# Altium footprint library 封装库.PcbLib: 755 footprints (part 5 of 48) (continued)
## BGA27X27-B352 [mm] (continued)
Top Overlay:
  lines w0.2: -1,-26 26,-26 26,1 -0.5,1 -1,0.5 -1,-26

## BGA27X27-B429 [mm]
pads (429):
  round 0.6 smd: A3(2.54,0) A4(3.81,0) A5(5.08,0) A6(6.35,0) A7(7.62,0) A8(8.89,0) A9(10.16,0) A10(11.43,0) A11(12.7,0) A12(13.97,0) A13(15.24,0) A14(16.51,0) A15(17.78,0) A16(19.05,0) A17(20.32,0) A18(21.59,0) A19(22.86,0) AA3(2.54,-25.4) AA4(3.81,-25.4) AA5(5.08,-25.4) AA6(6.35,-25.4) AA7(7.62,-25.4) AA8(8.89,-25.4) AA9(10.16,-25.4) AA10(11.43,-25.4) AA11(12.7,-25.4) AA12(13.97,-25.4) AA13(15.24,-25.4) AA14(16.51,-25.4) AA15(17.78,-25.4) AA16(19.05,-25.4) AA17(20.32,-25.4) AA18(21.59,-25.4) AA19(22.86,-25.4) B2(1.27,-1.27) B3(2.54,-1.27) B4(3.81,-1.27) B5(5.08,-1.27) B6(6.35,-1.27) B7(7.62,-1.27) B8(8.89,-1.27) B9(10.16,-1.27) B10(11.43,-1.27) B11(12.7,-1.27) B12(13.97,-1.27) B13(15.24,-1.27) B14(16.51,-1.27) B15(17.78,-1.27) B16(19.05,-1.27) B17(20.32,-1.27) B18(21.59,-1.27) B19(22.86,-1.27) B20(24.13,-1.27) C1(0,-2.54) C2(1.27,-2.54) C3(2.54,-2.54) C4(3.81,-2.54) C5(5.08,-2.54) C6(6.35,-2.54) C7(7.62,-2.54) C8(8.89,-2.54) C9(10.16,-2.54) C10(11.43,-2.54) C11(12.7,-2.54) C12(13.97,-2.54) C13(15.24,-2.54) C14(16.51,-2.54) C15(17.78,-2.54) C16(19.05,-2.54) C17(20.32,-2.54) C18(21.59,-2.54) C19(22.86,-2.54) C20(24.13,-2.54) C21(25.4,-2.54) D1(0,-3.81) D2(1.27,-3.81) D3(2.54,-3.81) D4(3.81,-3.81) D5(5.08,-3.81) D6(6.35,-3.81) D7(7.62,-3.81) D8(8.89,-3.81) D9(10.16,-3.81) D10(11.43,-3.81) D11(12.7,-3.81) D12(13.97,-3.81) D13(15.24,-3.81) D14(16.51,-3.81) D15(17.78,-3.81) D16(19.05,-3.81) D17(20.32,-3.81) D18(21.59,-3.81) D19(22.86,-3.81) D20(24.13,-3.81) D21(25.4,-3.81) E1(0,-5.08) E2(1.27,-5.08) E3(2.54,-5.08) E4(3.81,-5.08) E5(5.08,-5.08) E6(6.35,-5.08) E7(7.62,-5.08) E8(8.89,-5.08) E9(10.16,-5.08) E10(11.43,-5.08) E11(12.7,-5.08) E12(13.97,-5.08) E13(15.24,-5.08) E14(16.51,-5.08) E15(17.78,-5.08) E16(19.05,-5.08) E17(20.32,-5.08) E18(21.59,-5.08) E19(22.86,-5.08) E20(24.13,-5.08) E21(25.4,-5.08) F1(0,-6.35) F2(1.27,-6.35) F3(2.54,-6.35) F4(3.81,-6.35) F5(5.08,-6.35) F6(6.35,-6.35) F7(7.62,-6.35) F8(8.89,-6.35) F9(10.16,-6.35) F10(11.43,-6.35) F11(12.7,-6.35) F12(13.97,-6.35) F13(15.24,-6.35) F14(16.51,-6.35) F15(17.78,-6.35) F16(19.05,-6.35) F17(20.32,-6.35) F18(21.59,-6.35) F19(22.86,-6.35) F20(24.13,-6.35) F21(25.4,-6.35) G1(0,-7.62) G2(1.27,-7.62) G3(2.54,-7.62) G4(3.81,-7.62) G5(5.08,-7.62) G6(6.35,-7.62) G7(7.62,-7.62) G8(8.89,-7.62) G9(10.16,-7.62) G10(11.43,-7.62) G11(12.7,-7.62) G12(13.97,-7.62) G13(15.24,-7.62) G14(16.51,-7.62) G15(17.78,-7.62) G16(19.05,-7.62) G17(20.32,-7.62) G18(21.59,-7.62) G19(22.86,-7.62) G20(24.13,-7.62) G21(25.4,-7.62) H1(0,-8.89) H2(1.27,-8.89) H3(2.54,-8.89) H4(3.81,-8.89) H5(5.08,-8.89) H6(6.35,-8.89) H7(7.62,-8.89) H8(8.89,-8.89) H9(10.16,-8.89) H10(11.43,-8.89) H11(12.7,-8.89) H12(13.97,-8.89) H13(15.24,-8.89) H14(16.51,-8.89) H15(17.78,-8.89) H16(19.05,-8.89) H17(20.32,-8.89) H18(21.59,-8.89) H19(22.86,-8.89) H20(24.13,-8.89) H21(25.4,-8.89) J1(0,-10.16) J2(1.27,-10.16) J3(2.54,-10.16) J4(3.81,-10.16) J5(5.08,-10.16) J6(6.35,-10.16) J7(7.62,-10.16) J8(8.89,-10.16) J9(10.16,-10.16) J10(11.43,-10.16) J11(12.7,-10.16) J12(13.97,-10.16) J13(15.24,-10.16) J14(16.51,-10.16) J15(17.78,-10.16) J16(19.05,-10.16) J17(20.32,-10.16) J18(21.59,-10.16) J19(22.86,-10.16) J20(24.13,-10.16) J21(25.4,-10.16) K1(0,-11.43) K2(1.27,-11.43) K3(2.54,-11.43) K4(3.81,-11.43) K5(5.08,-11.43) K6(6.35,-11.43) K7(7.62,-11.43) K8(8.89,-11.43) K9(10.16,-11.43) K10(11.43,-11.43) K11(12.7,-11.43) K12(13.97,-11.43) K13(15.24,-11.43) K14(16.51,-11.43) K15(17.78,-11.43) K16(19.05,-11.43) K17(20.32,-11.43) K18(21.59,-11.43) K19(22.86,-11.43) K20(24.13,-11.43) K21(25.4,-11.43) L1(0,-12.7) L2(1.27,-12.7) L3(2.54,-12.7) L4(3.81,-12.7) L5(5.08,-12.7) L6(6.35,-12.7) L7(7.62,-12.7) L8(8.89,-12.7) L9(10.16,-12.7) L10(11.43,-12.7) L11(12.7,-12.7) L12(13.97,-12.7) L13(15.24,-12.7) L14(16.51,-12.7) L15(17.78,-12.7) L16(19.05,-12.7) L17(20.32,-12.7) L18(21.59,-12.7) L19(22.86,-12.7) L20(24.13,-12.7) L21(25.4,-12.7) M1(0,-13.97) M2(1.27,-13.97) M3(2.54,-13.97) M4(3.81,-13.97) M5(5.08,-13.97) M6(6.35,-13.97) M7(7.62,-13.97) M8(8.89,-13.97) M9(10.16,-13.97) M10(11.43,-13.97) M11(12.7,-13.97) M12(13.97,-13.97) M13(15.24,-13.97) M14(16.51,-13.97) M15(17.78,-13.97) M16(19.05,-13.97) M17(20.32,-13.97) M18(21.59,-13.97) M19(22.86,-13.97) M20(24.13,-13.97) M21(25.4,-13.97) N1(0,-15.24) N2(1.27,-15.24) N3(2.54,-15.24) N4(3.81,-15.24) N5(5.08,-15.24) N6(6.35,-15.24) N7(7.62,-15.24) N8(8.89,-15.24) N9(10.16,-15.24) N10(11.43,-15.24) N11(12.7,-15.24) N12(13.97,-15.24) N13(15.24,-15.24) N14(16.51,-15.24) N15(17.78,-15.24) N16(19.05,-15.24) N17(20.32,-15.24) N18(21.59,-15.24) N19(22.86,-15.24) N20(24.13,-15.24) N21(25.4,-15.24) P1(0,-16.51) P2(1.27,-16.51) P3(2.54,-16.51) P4(3.81,-16.51) P5(5.08,-16.51) P6(6.35,-16.51) P7(7.62,-16.51) P8(8.89,-16.51) P9(10.16,-16.51) P10(11.43,-16.51) P11(12.7,-16.51) P12(13.97,-16.51) P13(15.24,-16.51) P14(16.51,-16.51) P15(17.78,-16.51) P16(19.05,-16.51) P17(20.32,-16.51) P18(21.59,-16.51) P19(22.86,-16.51) P20(24.13,-16.51) P21(25.4,-16.51) R1(0,-17.78) R2(1.27,-17.78) R3(2.54,-17.78) R4(3.81,-17.78) R5(5.08,-17.78) R6(6.35,-17.78) R7(7.62,-17.78) R8(8.89,-17.78) R9(10.16,-17.78) R10(11.43,-17.78) R11(12.7,-17.78) R12(13.97,-17.78) R13(15.24,-17.78) R14(16.51,-17.78) R15(17.78,-17.78) R16(19.05,-17.78) R17(20.32,-17.78) R18(21.59,-17.78) R19(22.86,-17.78) R20(24.13,-17.78) R21(25.4,-17.78) T1(0,-19.05) T2(1.27,-19.05) T3(2.54,-19.05) T4(3.81,-19.05) T5(5.08,-19.05) T6(6.35,-19.05) T7(7.62,-19.05) T8(8.89,-19.05) T9(10.16,-19.05) T10(11.43,-19.05) T11(12.7,-19.05) T12(13.97,-19.05) T13(15.24,-19.05) T14(16.51,-19.05) T15(17.78,-19.05) T16(19.05,-19.05) T17(20.32,-19.05) T18(21.59,-19.05) T19(22.86,-19.05) T20(24.13,-19.05) T21(25.4,-19.05) U1(0,-20.32) U2(1.27,-20.32) U3(2.54,-20.32) U4(3.81,-20.32) U5(5.08,-20.32) U6(6.35,-20.32) U7(7.62,-20.32) U8(8.89,-20.32) U9(10.16,-20.32) U10(11.43,-20.32) U11(12.7,-20.32) U12(13.97,-20.32) U13(15.24,-20.32) U14(16.51,-20.32) U15(17.78,-20.32) U16(19.05,-20.32) U17(20.32,-20.32) U18(21.59,-20.32) U19(22.86,-20.32) U20(24.13,-20.32) U21(25.4,-20.32) V1(0,-21.59) V2(1.27,-21.59) V3(2.54,-21.59) V4(3.81,-21.59) V5(5.08,-21.59) V6(6.35,-21.59) V7(7.62,-21.59) V8(8.89,-21.59) V9(10.16,-21.59) V10(11.43,-21.59) V11(12.7,-21.59) V12(13.97,-21.59) V13(15.24,-21.59) V14(16.51,-21.59) V15(17.78,-21.59) V16(19.05,-21.59) V17(20.32,-21.59) V18(21.59,-21.59) V19(22.86,-21.59) V20(24.13,-21.59) V21(25.4,-21.59) W1(0,-22.86) W2(1.27,-22.86) W3(2.54,-22.86) W4(3.81,-22.86) W5(5.08,-22.86) W6(6.35,-22.86) W7(7.62,-22.86) W8(8.89,-22.86) W9(10.16,-22.86) W10(11.43,-22.86) W11(12.7,-22.86) W12(13.97,-22.86) W13(15.24,-22.86) W14(16.51,-22.86) W15(17.78,-22.86) W16(19.05,-22.86) W17(20.32,-22.86) W18(21.59,-22.86) W19(22.86,-22.86) W20(24.13,-22.86) W21(25.4,-22.86) Y2(1.27,-24.13) Y3(2.54,-24.13) Y4(3.81,-24.13) Y5(5.08,-24.13) Y6(6.35,-24.13) Y7(7.62,-24.13) Y8(8.89,-24.13) Y9(10.16,-24.13) Y10(11.43,-24.13) Y11(12.7,-24.13) Y12(13.97,-24.13) Y13(15.24,-24.13) Y14(16.51,-24.13) Y15(17.78,-24.13) Y16(19.05,-24.13) Y17(20.32,-24.13) Y18(21.59,-24.13) Y19(22.86,-24.13) Y20(24.13,-24.13)
Top Overlay:
  lines w0.2: -0.8,-26.2 26.2,-26.2 26.2,0.8 -0.4,0.8 -0.8,0.4 -0.8,-26.2

## BGA35X35-B352 [mm]
pads (352):
  oct 0.6x0.6 smd: A1(0,0)
  round 0.6 smd: A2(1.27,0) A3(2.54,0) A4(3.81,0) A5(5.08,0) A6(6.35,0) A7(7.62,0) A8(8.89,0) A9(10.16,0) A10(11.43,0) A11(12.7,0) A12(13.97,0) A13(15.24,0) A14(16.51,0) A15(17.78,0) A16(19.05,0) A17(20.32,0) A18(21.59,0) A19(22.86,0) A20(24.13,0) A21(25.4,0) A22(26.67,0) A23(27.94,0) A24(29.21,0) A25(30.48,0) A26(31.75,0) AA1(0,-25.4) AA2(1.27,-25.4) AA3(2.54,-25.4) AA4(3.81,-25.4) AA23(27.94,-25.4) AA24(29.21,-25.4) AA25(30.48,-25.4) AA26(31.75,-25.4) AB1(0,-26.67) AB2(1.27,-26.67) AB3(2.54,-26.67) AB4(3.81,-26.67) AB23(27.94,-26.67) AB24(29.21,-26.67) AB25(30.48,-26.67) AB26(31.75,-26.67) AC1(0,-27.94) AC2(1.27,-27.94) AC3(2.54,-27.94) AC4(3.81,-27.94) AC5(5.08,-27.94) AC6(6.35,-27.94) AC7(7.62,-27.94) AC8(8.89,-27.94) AC9(10.16,-27.94) AC10(11.43,-27.94) AC11(12.7,-27.94) AC12(13.97,-27.94) AC13(15.24,-27.94) AC14(16.51,-27.94) AC15(17.78,-27.94) AC16(19.05,-27.94) AC17(20.32,-27.94) AC18(21.59,-27.94) AC19(22.86,-27.94) AC20(24.13,-27.94) AC21(25.4,-27.94) AC22(26.67,-27.94) AC23(27.94,-27.94) AC24(29.21,-27.94) AC25(30.48,-27.94) AC26(31.75,-27.94) AD1(0,-29.21) AD2(1.27,-29.21) AD3(2.54,-29.21) AD4(3.81,-29.21) AD5(5.08,-29.21) AD6(6.35,-29.21) AD7(7.62,-29.21) AD8(8.89,-29.21) AD9(10.16,-29.21) AD10(11.43,-29.21) AD11(12.7,-29.21) AD12(13.97,-29.21) AD13(15.24,-29.21) AD14(16.51,-29.21) AD15(17.78,-29.21) AD16(19.05,-29.21) AD17(20.32,-29.21) AD18(21.59,-29.21) AD19(22.86,-29.21) AD20(24.13,-29.21) AD21(25.4,-29.21) AD22(26.67,-29.21) AD23(27.94,-29.21) AD24(29.21,-29.21) AD25(30.48,-29.21) AD26(31.75,-29.21) AE1(0,-30.48) AE2(1.27,-30.48) AE3(2.54,-30.48) AE4(3.81,-30.48) AE5(5.08,-30.48) AE6(6.35,-30.48) AE7(7.62,-30.48) AE8(8.89,-30.48) AE9(10.16,-30.48) AE10(11.43,-30.48) AE11(12.7,-30.48) AE12(13.97,-30.48) AE13(15.24,-30.48) AE14(16.51,-30.48) AE15(17.78,-30.48) AE16(19.05,-30.48) AE17(20.32,-30.48) AE18(21.59,-30.48) AE19(22.86,-30.48) AE20(24.13,-30.48) AE21(25.4,-30.48) AE22(26.67,-30.48) AE23(27.94,-30.48) AE24(29.21,-30.48) AE25(30.48,-30.48) AE26(31.75,-30.48) AF1(0,-31.75) AF2(1.27,-31.75) AF3(2.54,-31.75) AF4(3.81,-31.75) AF5(5.08,-31.75) AF6(6.35,-31.75) AF7(7.62,-31.75) AF8(8.89,-31.75) AF9(10.16,-31.75) AF10(11.43,-31.75) AF11(12.7,-31.75) AF12(13.97,-31.75) AF13(15.24,-31.75) AF14(16.51,-31.75) AF15(17.78,-31.75) AF16(19.05,-31.75) AF17(20.32,-31.75) AF18(21.59,-31.75) AF19(22.86,-31.75) AF20(24.13,-31.75) AF21(25.4,-31.75) AF22(26.67,-31.75) AF23(27.94,-31.75) AF24(29.21,-31.75) AF25(30.48,-31.75) AF26(31.75,-31.75) B1(0,-1.27) B2(1.27,-1.27) B3(2.54,-1.27) B4(3.81,-1.27) B5(5.08,-1.27) B6(6.35,-1.27) B7(7.62,-1.27) B8(8.89,-1.27) B9(10.16,-1.27) B10(11.43,-1.27) B11(12.7,-1.27) B12(13.97,-1.27) B13(15.24,-1.27) B14(16.51,-1.27) B15(17.78,-1.27) B16(19.05,-1.27) B17(20.32,-1.27) B18(21.59,-1.27) B19(22.86,-1.27) B20(24.13,-1.27) B21(25.4,-1.27) B22(26.67,-1.27) B23(27.94,-1.27) B24(29.21,-1.27) B25(30.48,-1.27) B26(31.75,-1.27) C1(0,-2.54) C2(1.27,-2.54) C3(2.54,-2.54) C4(3.81,-2.54) C5(5.08,-2.54) C6(6.35,-2.54) C7(7.62,-2.54) C8(8.89,-2.54) C9(10.16,-2.54) C10(11.43,-2.54) C11(12.7,-2.54) C12(13.97,-2.54) C13(15.24,-2.54) C14(16.51,-2.54) C15(17.78,-2.54) C16(19.05,-2.54) C17(20.32,-2.54) C18(21.59,-2.54) C19(22.86,-2.54) C20(24.13,-2.54) C21(25.4,-2.54) C22(26.67,-2.54) C23(27.94,-2.54) C24(29.21,-2.54) C25(30.48,-2.54) C26(31.75,-2.54) D1(0,-3.81) D2(1.27,-3.81) D3(2.54,-3.81) D4(3.81,-3.81) D5(5.08,-3.81) D6(6.35,-3.81) D7(7.62,-3.81) D8(8.89,-3.81) D9(10.16,-3.81) D10(11.43,-3.81) D11(12.7,-3.81) D12(13.97,-3.81) D13(15.24,-3.81) D14(16.51,-3.81) D15(17.78,-3.81) D16(19.05,-3.81) D17(20.32,-3.81) D18(21.59,-3.81) D19(22.86,-3.81) D20(24.13,-3.81) D21(25.4,-3.81) D22(26.67,-3.81) D23(27.94,-3.81) D24(29.21,-3.81) D25(30.48,-3.81) D26(31.75,-3.81) E1(0,-5.08) E2(1.27,-5.08) E3(2.54,-5.08) E4(3.81,-5.08) E23(27.94,-5.08) E24(29.21,-5.08) E25(30.48,-5.08) E26(31.75,-5.08) F1(0,-6.35) F2(1.27,-6.35) F3(2.54,-6.35) F4(3.81,-6.35) F23(27.94,-6.35) F24(29.21,-6.35) F25(30.48,-6.35) F26(31.75,-6.35) G1(0,-7.62) G2(1.27,-7.62) G3(2.54,-7.62) G4(3.81,-7.62) G23(27.94,-7.62) G24(29.21,-7.62) G25(30.48,-7.62) G26(31.75,-7.62) H1(0,-8.89) H2(1.27,-8.89) H3(2.54,-8.89) H4(3.81,-8.89) H23(27.94,-8.89) H24(29.21,-8.89) H25(30.48,-8.89) H26(31.75,-8.89) J1(0,-10.16) J2(1.27,-10.16) J3(2.54,-10.16) J4(3.81,-10.16) J23(27.94,-10.16) J24(29.21,-10.16) J25(30.48,-10.16) J26(31.75,-10.16) K1(0,-11.43) K2(1.27,-11.43) K3(2.54,-11.43) K4(3.81,-11.43) K23(27.94,-11.43) K24(29.21,-11.43) K25(30.48,-11.43) K26(31.75,-11.43) L1(0,-12.7) L2(1.27,-12.7) L3(2.54,-12.7) L4(3.81,-12.7) L23(27.94,-12.7) L24(29.21,-12.7) L25(30.48,-12.7) L26(31.75,-12.7) M1(0,-13.97) M2(1.27,-13.97) M3(2.54,-13.97) M4(3.81,-13.97) M23(27.94,-13.97) M24(29.21,-13.97) M25(30.48,-13.97) M26(31.75,-13.97) N1(0,-15.24) N2(1.27,-15.24) N3(2.54,-15.24) N4(3.81,-15.24) N23(27.94,-15.24) N24(29.21,-15.24) N25(30.48,-15.24) N26(31.75,-15.24) P1(0,-16.51) P2(1.27,-16.51) P3(2.54,-16.51) P4(3.81,-16.51) P23(27.94,-16.51) P24(29.21,-16.51) P25(30.48,-16.51) P26(31.75,-16.51) R1(0,-17.78) R2(1.27,-17.78) R3(2.54,-17.78) R4(3.81,-17.78) R23(27.94,-17.78) R24(29.21,-17.78) R25(30.48,-17.78) R26(31.75,-17.78) T1(0,-19.05) T2(1.27,-19.05) T3(2.54,-19.05) T4(3.81,-19.05) T23(27.94,-19.05) T24(29.21,-19.05) T25(30.48,-19.05) T26(31.75,-19.05) U1(0,-20.32) U2(1.27,-20.32) U3(2.54,-20.32) U4(3.81,-20.32) U23(27.94,-20.32) U24(29.21,-20.32) U25(30.48,-20.32) U26(31.75,-20.32) V1(0,-21.59) V2(1.27,-21.59) V3(2.54,-21.59) V4(3.81,-21.59) V23(27.94,-21.59) V24(29.21,-21.59) V25(30.48,-21.59) V26(31.75,-21.59) W1(0,-22.86) W2(1.27,-22.86) W3(2.54,-22.86) W4(3.81,-22.86) W23(27.94,-22.86) W24(29.21,-22.86) W25(30.48,-22.86) W26(31.75,-22.86) Y1(0,-24.13) Y2(1.27,-24.13) Y3(2.54,-24.13) Y4(3.81,-24.13) Y23(27.94,-24.13) Y24(29.21,-24.13) Y25(30.48,-24.13) Y26(31.75,-24.13)
Top Overlay:
  lines w0.2: -1.625,-33.375 33.375,-33.375 33.375,1.625 -0.812,1.625 -1.625,0.812 -1.625,-33.375

## BGA272 [mm]
pads (272):
  round 0.4 smd: A1(0.011,0.004) A2(0.811,0.004) A3(1.611,0.004) A4(2.411,0.004) A5(3.211,0.004) A6(4.011,0.004) A7(4.811,0.004) A8(5.611,0.004) A9(6.411,0.004) A10(7.211,0.004) A11(8.011,0.004) A12(8.811,0.004) A13(9.611,0.004) A14(10.411,0.004) A15(11.211,0.004) A16(12.011,0.004) A17(12.811,0.004) B1(0.011,-0.796) B2(0.811,-0.796) B3(1.611,-0.796) B4(2.411,-0.796) B5(3.211,-0.796) B6(4.011,-0.796) B7(4.811,-0.796) B8(5.611,-0.796) B9(6.411,-0.796) B10(7.211,-0.796) B11(8.011,-0.796) B12(8.811,-0.796) B13(9.611,-0.796) B14(10.411,-0.796) B15(11.211,-0.796) B16(12.011,-0.796) B17(12.811,-0.796) C1(0.011,-1.596) C2(0.811,-1.596) C3(1.611,-1.596) C4(2.411,-1.596) C5(3.211,-1.596) C6(4.011,-1.596) C7(4.811,-1.596) C8(5.611,-1.596) C9(6.411,-1.596) C10(7.211,-1.596) C11(8.011,-1.596) C12(8.811,-1.596) C13(9.611,-1.596) C14(10.411,-1.596) C15(11.211,-1.596) C16(12.011,-1.596) C17(12.811,-1.596) D1(0.011,-2.396) D2(0.811,-2.396) D3(1.611,-2.396) D4(2.411,-2.396) D5(3.211,-2.396) D6(4.011,-2.396) D7(4.811,-2.396) D8(5.611,-2.396) D9(6.411,-2.396) D10(7.211,-2.396) D11(8.011,-2.396) D12(8.811,-2.396) D13(9.611,-2.396) D14(10.411,-2.396) D15(11.211,-2.396) D16(12.011,-2.396) D17(12.811,-2.396) E1(0.011,-3.196) E2(0.811,-3.196) E3(1.611,-3.196) E4(2.411,-3.196) E5(3.211,-3.196) E6(4.011,-3.196) E7(4.811,-3.196) E8(5.611,-3.196) E9(6.411,-3.196) E10(7.211,-3.196) E11(8.011,-3.196) E12(8.811,-3.196) E13(9.611,-3.196) E14(10.411,-3.196) E15(11.211,-3.196) E16(12.011,-3.196) E17(12.811,-3.196) F1(0.011,-3.996) F2(0.811,-3.996) F3(1.611,-3.996) F4(2.411,-3.996) F5(3.211,-3.996) F6(4.011,-3.996) F7(4.811,-3.996) F8(5.611,-3.996) F9(6.411,-3.996) F10(7.211,-3.996) F11(8.011,-3.996) F12(8.811,-3.996) F13(9.611,-3.996) F14(10.411,-3.996) F15(11.211,-3.996) F16(12.011,-3.996) F17(12.811,-3.996) G1(0.011,-4.796) G2(0.811,-4.796) G3(1.611,-4.796) G4(2.411,-4.796) G5(3.211,-4.796) G6(4.011,-4.796) G7(4.811,-4.796) G9(6.411,-4.796) G11(8.011,-4.796) G12(8.811,-4.796) G13(9.611,-4.796) G14(10.411,-4.796) G15(11.211,-4.796) G16(12.011,-4.796) G17(12.811,-4.796) H1(0.011,-5.596) H2(0.811,-5.596) H3(1.611,-5.596) H4(2.411,-5.596) H5(3.211,-5.596) H6(4.011,-5.596) H12(8.811,-5.596) H13(9.611,-5.596) H14(10.411,-5.596) H15(11.211,-5.596) H16(12.011,-5.596) H17(12.811,-5.596) J1(0.011,-6.396) J2(0.811,-6.396) J3(1.611,-6.396) J4(2.411,-6.396) J5(3.211,-6.396) J6(4.011,-6.396) J7(4.811,-6.396) J11(8.011,-6.396) J12(8.811,-6.396) J13(9.611,-6.396) J14(10.411,-6.396) J15(11.211,-6.396) J16(12.011,-6.396) J17(12.811,-6.396) K1(0.011,-7.196) K2(0.811,-7.196) K3(1.611,-7.196) K4(2.411,-7.196) K5(3.211,-7.196) K6(4.011,-7.196) K12(8.811,-7.196) K13(9.611,-7.196) K14(10.411,-7.196) K15(11.211,-7.196) K16(12.011,-7.196) K17(12.811,-7.196) L1(0.011,-7.996) L2(0.811,-7.996) L3(1.611,-7.996) L4(2.411,-7.996) L5(3.211,-7.996) L6(4.011,-7.996) L7(4.811,-7.996) L9(6.411,-7.996) L11(8.011,-7.996) L12(8.811,-7.996) L13(9.611,-7.996) L14(10.411,-7.996) L15(11.211,-7.996) L16(12.011,-7.996) L17(12.811,-7.996) M1(0.011,-8.796) M2(0.811,-8.796) M3(1.611,-8.796) M4(2.411,-8.796) M5(3.211,-8.796) M6(4.011,-8.796) M7(4.811,-8.796) M8(5.611,-8.796) M9(6.411,-8.796) M10(7.211,-8.796) M11(8.011,-8.796) M12(8.811,-8.796) M13(9.611,-8.796) M14(10.411,-8.796) M15(11.211,-8.796) M16(12.011,-8.796) M17(12.811,-8.796) N1(0.011,-9.596) N2(0.811,-9.596) N3(1.611,-9.596) N4(2.411,-9.596) N5(3.211,-9.596) N6(4.011,-9.596) N7(4.811,-9.596) N8(5.611,-9.596) N9(6.411,-9.596) N10(7.211,-9.596) N11(8.011,-9.596) N12(8.811,-9.596) N13(9.611,-9.596) N14(10.411,-9.596) N15(11.211,-9.596) N16(12.011,-9.596) N17(12.811,-9.596) P1(0.011,-10.396) P2(0.811,-10.396) P3(1.611,-10.396) P4(2.411,-10.396) P5(3.211,-10.396) P6(4.011,-10.396) P7(4.811,-10.396) P8(5.611,-10.396) P9(6.411,-10.396) P10(7.211,-10.396) P11(8.011,-10.396) P12(8.811,-10.396) P13(9.611,-10.396) P14(10.411,-10.396) P15(11.211,-10.396) P16(12.011,-10.396) P17(12.811,-10.396) R1(0.011,-11.196) R2(0.811,-11.196) R3(1.611,-11.196) R4(2.411,-11.196) R5(3.211,-11.196) R6(4.011,-11.196) R7(4.811,-11.196) R8(5.611,-11.196) R9(6.411,-11.196) R10(7.211,-11.196) R11(8.011,-11.196) R12(8.811,-11.196) R13(9.611,-11.196) R14(10.411,-11.196) R15(11.211,-11.196) R16(12.011,-11.196) R17(12.811,-11.196) T1(0.011,-11.996) T2(0.811,-11.996) T3(1.611,-11.996) T4(2.411,-11.996) T5(3.211,-11.996) T6(4.011,-11.996) T7(4.811,-11.996) T8(5.611,-11.996) T9(6.411,-11.996) T10(7.211,-11.996) T11(8.011,-11.996) T12(8.811,-11.996) T13(9.611,-11.996) T14(10.411,-11.996) T15(11.211,-11.996) T16(12.011,-11.996) T17(12.811,-11.996) U1(0.011,-12.796) U2(0.811,-12.796) U3(1.611,-12.796) U4(2.411,-12.796) U5(3.211,-12.796) U6(4.011,-12.796) U7(4.811,-12.796) U8(5.611,-12.796) U9(6.411,-12.796) U10(7.211,-12.796) U11(8.011,-12.796) U12(8.811,-12.796) U13(9.611,-12.796) U14(10.411,-12.796) U15(11.211,-12.796) U16(12.011,-12.796) U17(12.811,-12.796)
Top Overlay:
  lines w0.2: -0.789,-13.596 -0.789,0.004 0.011,0.804 13.611,0.804 13.611,-13.596 -0.789,-13.596

## BNC_RA CON [mm] "Connector; BNC Elbow"
pads (4):
  rect 1.5x1.5 hole 0.9: 1(0,0)
  round 3.3 hole 2: 2(-5.1,-5.1) 2(-5.1,5.1)
  round 1.5 hole 0.9: 2(0,-2.5)
Top Overlay:
  circle w0.025: c-28.9,0 r1
  lines w0.025: -20.1,-6.25 -21.1,6.25 ; -20.1,6.25 -19.1,-6.25 ; -19.1,6.25 -18.1,-6.25 ; -18.1,6.25 -17.1,-6.25 ; -17.1,6.25 -16.1,-6.25 ; -16.1,6.25 -15.1,-6.25 ; -15.1,6.25 -14.1,-6.25 ; -14.1,6.25 -13.1,-6.25 ; -21.1,-4.8 -21.1,-6.25 -12.2,-6.25 ; -21.1,-4.8 -21.1,4.8 ; -21.1,-4.8 -33,-4.8 -33,4.8 -21.1,4.8 ; -21.1,4.8 -21.1,6.25 ; -21.1,6.25 -12.2,6.25 ; -12.2,-6.25 -12.2,-7.4 1.9,-7.4 1.9,7.4 -12.2,7.4 -12.2,6.25 ; -12.2,-6.25 -12.2,6.25 ; -11,-5.9 -11,5.9 -3,5.9 -3,-5.9 -11,-5.9
  lines w0.2: -21.1,-4.8 -21.1,-6.25 -12.2,-6.25 ; -21.1,-4.8 -33,-4.8 -33,4.8 -21.1,4.8 ; -21.1,-4.8 -21.1,4.8 ; -21.1,4.8 -21.1,6.25 -12.2,6.25 ; -12.2,-6.25 -12.2,-7.4 1.9,-7.4 1.9,7.4 -12.2,7.4 -12.2,6.25 ; -12.2,-6.25 -12.2,6.25

## bridge [mm]
pads (4):
  rect 1.5x1.5 hole 0.9: 1(0,0)
  round 1.5 hole 0.9: 2(0,-5.08) 3(5.08,-5.08) 4(5.08,0)
Top Overlay:
  lines w0.2: -2.54,-7.62 -2.54,2.54 3.81,2.54 3.495,2.54 7.686,2.54 7.686,-2.54 7.654,-7.583 7.685,-7.62 -2.54,-7.62
  text "_" at 5.715,-6.223 h1.52
  text "+" at -1.905,0.508 h1.52
  text "~" at -2.032,-8.001 h1.52
  text "~" at 5.715,-0.127 h1.52

## BT04 [mm]
pads (4):
  rect 3.5x3.5 hole 1.4: 1(-5.4,-5.4)
  round 3.5 hole 1.4: 2(5.4,-5.4) 3(5.4,5.4) 4(-5.4,5.4)
Top Overlay:
  lines w0.254: -6.096,-3.048 cw(c-4.064,-3.048) -2.032,-3.048 cw(c0,-3.048) 2.032,-3.048 cw(c4.064,-3.048) 6.096,-3.048 ; -6.096,0 6.096,0 ; -6.096,3.048 ccw(c-4.064,3.048) -2.032,3.048 ccw(c0,3.048) 2.032,3.048 ccw(c4.064,3.048) 6.096,3.048